# Altium footprint library hphonglib.PcbLib: 703 footprints (part 35 of 44)
Each footprint in its own frame and in the unit in brackets; x right, y up, seen from the top. Pads: shape width x height; smd on the part's side, far side on the other; paste and mask are expansions set on the pad; w line width, h text height; cw(c..) or ccw(c..) is an arc to the next point about the centre after c.
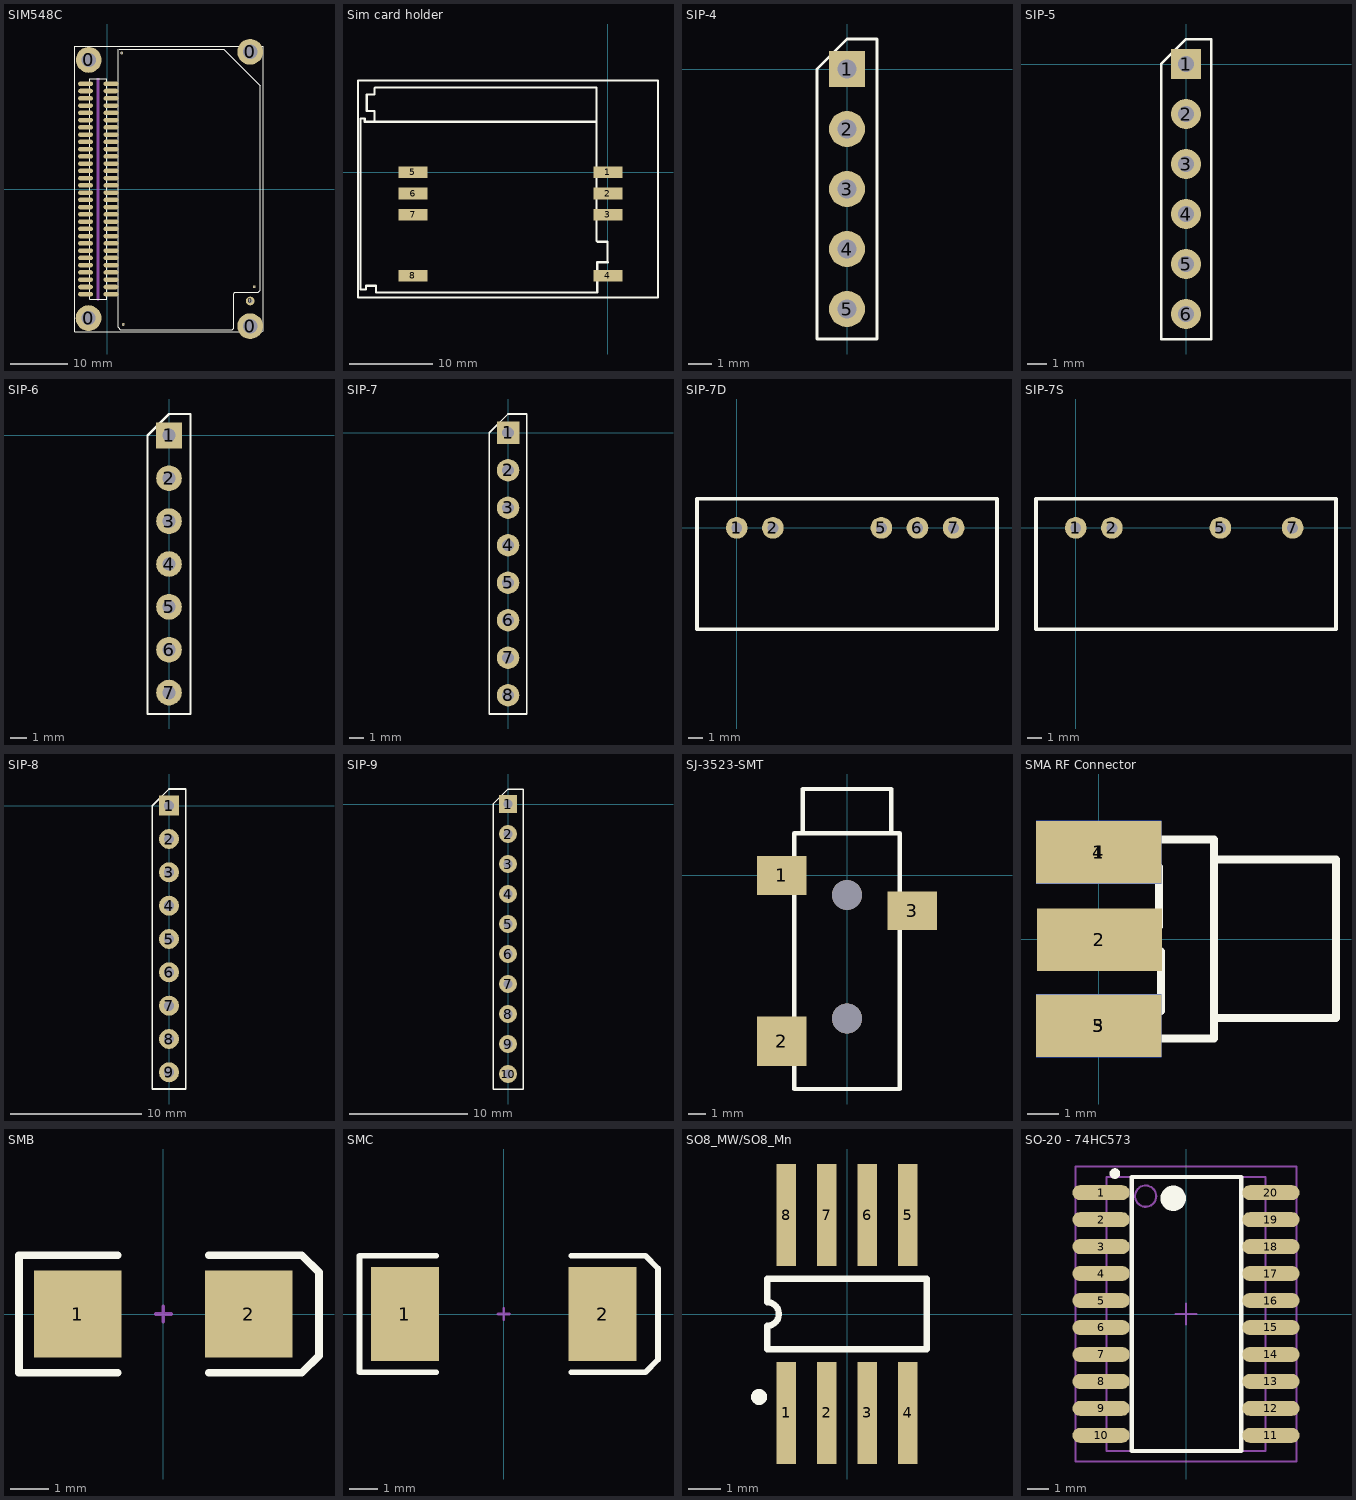
[diagram p34: the footprints below, top view; thin cyan lines are the x and y axes]

## SIM548C [mm] "SIM548C-60PIN"
pads (68):
  round 4.5 hole 2.5: 0(-3.28,-22.59) 0(-3.25,22.59) 0(25,-24) 0(25,24)
  round 0.5 hole 0.3: 0(2.5,23.8) 0(2.8,-23.7) 0(25.7,-17.1)
  round 1.524 hole 0.762: 0(25,-19.6)
  oval 2.6x0.8 smd: 1(-3.81,18.415) 2(0.635,18.415) 3(-3.81,17.145) 4(0.635,17.145) 5(-3.81,15.875) 6(0.635,15.875) 7(-3.81,14.605) 8(0.635,14.605) 9(-3.81,13.335) 10(0.635,13.335) 11(-3.81,12.065) 12(0.635,12.065) 13(-3.81,10.795) 14(0.635,10.795) 15(-3.81,9.525) 16(0.635,9.525) 17(-3.81,8.255) 18(0.635,8.255) 19(-3.81,6.985) 20(0.635,6.985) 21(-3.81,5.715) 22(0.635,5.715) 23(-3.81,4.445) 24(0.635,4.445) 25(-3.81,3.175) 26(0.635,3.175) 27(-3.81,1.905) 28(0.635,1.905) 29(-3.81,0.635) 30(0.635,0.635) 31(-3.81,-0.635) 32(0.635,-0.635) 33(-3.81,-1.905) 34(0.635,-1.905) 35(-3.81,-3.175) 36(0.635,-3.175) 37(-3.81,-4.445) 38(0.635,-4.445) 39(-3.81,-5.715) 40(0.635,-5.715) 41(-3.81,-6.985) 42(0.635,-6.985) 43(-3.81,-8.255) 44(0.635,-8.255) 45(-3.81,-9.525) 46(0.635,-9.525) 47(-3.81,-10.795) 48(0.635,-10.795) 49(-3.81,-12.065) 50(0.635,-12.065) 51(-3.81,-13.335) 52(0.635,-13.335) 53(-3.81,-14.605) 54(0.635,-14.605) 55(-3.81,-15.875) 56(0.635,-15.875) 57(-3.81,-17.145) 58(0.635,-17.145) 59(-3.81,-18.415) 60(0.635,-18.415)
Top Overlay:
  lines w0.17: 1.9,24.5 1.9,-24.2 2.3,-24.6 21.9,-24.6 22.1,-24.4 22.1,-18.3 22.3,-18.1 26.4,-18.1 26.8,-17.7 26.8,18.1 20.4,24.5 2.1,24.5 ; -5.715,-25 -5.715,25 27.305,25 27.305,-24.765 27.07,-25 -5.715,-25 ; -3.095,-19.265 -3.095,19.265 -2.345,19.265 -0.845,19.265 -0.075,19.265 -0.075,-19.265 -3.095,-19.265
Mechanical 1:
  lines w0.508: -1.6,-19.3 -1.6,19.2
3D body: height 3.5, standoff 0, extent -2.6,4.1 -1.9,4.9
3D body: height 3.5, standoff 0, extent -2.6,5.3 -1.9,6.1
3D body: height 3.5, standoff 0, extent -2.6,6.6 -1.9,7.4
3D body: height 3.5, standoff 0, extent -2.6,2.8 -1.9,3.6
3D body: height 3.5, standoff 0, extent -2.6,1.5 -1.9,2.3
3D body: height 3.5, standoff 0, extent -2.6,0.3 -1.9,1.1
3D body: height 3.5, standoff 0, extent -2.6,-1.1 -1.9,-0.3
3D body: height 3.5, standoff 0, extent -2.6,-2.4 -1.9,-1.6
3D body: height 3.5, standoff 0, extent -2.6,-3.6 -1.9,-2.8
3D body: height 3.5, standoff 0, extent -2.6,-4.9 -1.9,-4.1
3D body: height 3.5, standoff 0, extent -2.65,-6.2 -1.95,-5.4
3D body: height 3.5, standoff 0, extent -2.6,-7.4 -1.9,-6.6
3D body: height 3.5, standoff 0, extent -2.6,-8.7 -1.9,-7.9
3D body: height 3.5, standoff 0, extent -2.6,-10 -1.9,-9.2
3D body: height 3.5, standoff 0, extent -2.6,-11.2 -1.9,-10.4
3D body: height 3.5, standoff 0, extent -2.6,-12.5 -1.9,-11.7
3D body: height 3.5, standoff 0, extent -2.6,-13.8 -1.9,-13
3D body: height 3.5, standoff 0, extent -2.6,-15 -1.9,-14.2
3D body: height 3.5, standoff 0, extent -2.6,-16.3 -1.9,-15.5
3D body: height 3.5, standoff 0, extent -2.6,-17.6 -1.9,-16.8
3D body: height 3.5, standoff 0, extent -2.6,-18.8 -1.9,-18
3D body: height 3.5, standoff 0, extent -1.3,-16.3 -0.6,-15.5
3D body: height 3.5, standoff 0, extent -1.3,-17.6 -0.6,-16.8
3D body: height 3.5, standoff 0, extent -1.3,-18.8 -0.6,-18
3D body: height 3.5, standoff 0, extent -1.3,-12.5 -0.6,-11.7
3D body: height 3.5, standoff 0, extent -1.3,-13.8 -0.6,-13
3D body: height 3.5, standoff 0, extent -1.3,-15 -0.6,-14.2
3D body: height 3.5, standoff 0, extent -1.3,-8.7 -0.6,-7.9
3D body: height 3.5, standoff 0, extent -1.3,-10 -0.6,-9.2
3D body: height 3.5, standoff 0, extent -1.3,-11.2 -0.6,-10.4
3D body: height 3.5, standoff 0, extent -1.3,-4.9 -0.6,-4.1
3D body: height 3.5, standoff 0, extent -1.3,-6.2 -0.6,-5.4
3D body: height 3.5, standoff 0, extent -1.3,-7.4 -0.6,-6.6
3D body: height 3.5, standoff 0, extent -1.3,-1.1 -0.6,-0.3
3D body: height 3.5, standoff 0, extent -1.3,-2.4 -0.6,-1.6
3D body: height 3.5, standoff 0, extent -1.3,-3.6 -0.6,-2.8
3D body: height 3.5, standoff 0, extent -1.3,2.8 -0.6,3.6
3D body: height 3.5, standoff 0, extent -1.3,1.5 -0.6,2.3
3D body: height 3.5, standoff 0, extent -1.3,0.3 -0.6,1.1
3D body: height 3.5, standoff 0, extent -1.3,6.6 -0.6,7.4
3D body: height 3.5, standoff 0, extent -1.3,5.3 -0.6,6.1
3D body: height 3.5, standoff 0, extent -1.3,4.1 -0.6,4.9
3D body: height 3.5, standoff 0, extent -1.3,10.4 -0.6,11.2
3D body: height 3.5, standoff 0, extent -1.3,9.1 -0.6,9.9
3D body: height 3.5, standoff 0, extent -1.3,7.9 -0.6,8.7
3D body: height 3.5, standoff 0, extent -1.3,11.7 -0.6,12.5
3D body: height 3.5, standoff 0, extent -1.3,12.9 -0.6,13.7
3D body: height 3.5, standoff 0, extent -1.3,14.2 -0.6,15
3D body: height 3.5, standoff 0, extent -1.3,15.5 -0.6,16.3
3D body: height 3.5, standoff 0, extent -1.3,16.7 -0.6,17.5
3D body: height 3.5, standoff 0, extent -2.6,7.8 -1.9,8.6
3D body: height 3.5, standoff 0, extent -2.6,9.1 -1.9,9.9
3D body: height 3.5, standoff 0, extent -2.6,10.4 -1.9,11.2
3D body: height 3.5, standoff 0, extent -2.6,11.7 -1.9,12.5
3D body: height 3.5, standoff 0, extent -2.6,12.9 -1.9,13.7
3D body: height 3.5, standoff 0, extent -2.6,14.2 -1.9,15
3D body: height 3.5, standoff 0, extent -2.6,15.5 -1.9,16.3
3D body: height 3.5, standoff 0, extent -2.6,16.7 -1.9,17.5
3D body: height 3.5, standoff 0, extent -2.6,18 -1.9,18.8
3D body: height 3.5, standoff 0, extent -1.3,18 -0.6,18.8
3D body: height 3.5, standoff 0, extent -3.1,-19.3 -0.1,19.2

## Sim card holder [mm]
pads (8):
  rect 3.5x1.4 smd: 1(0,0) 2(0,-2.54) 3(0,-5.08) 4(0,-12.4) 5(-23.4,0) 6(-23.4,-2.54) 7(-23.4,-5.08) 8(-23.4,-12.4)
Top Overlay:
  lines w0.254: -29.718,-14.072 -29.718,-12.395 ; -29.718,-12.522 -29.718,6.452 -29.185,6.452 -29.185,6.071 -28.016,6.071 -28.016,7.366 -28.956,7.366 -28.956,9.322 -28.042,9.322 -28.042,10.058 -27.94,10.16 -1.397,10.16 -1.397,6.071 -27.965,6.071 ; -29.667,-14.072 -29.058,-14.072 -29.032,-14.046 -29.032,-13.614 -27.864,-13.614 ; -27.838,-13.64 -27.838,-14.427 -1.295,-14.427 -1.295,-10.795 -0.025,-10.795 -0.051,-10.77 -0.051,-8.306 -0.076,-8.331 -1.27,-8.331 -1.397,-8.204 -1.397,6.045 ; -24.9,-15 4,-15 5,-15 6,-15 6,5 6,10 6,11 -30,11 -30,5 -30,-15 -29,-15 -28,-15 -24,-15
3D body: height 2.5, standoff 0, extent -24.92,-9.895 5.08,7.405

## SIP-4 [mil]
pads (5):
  rect 60x60 hole 31.49 unplated: 1(0,0)
  round 60 hole 31.49 unplated: 2(0,-100) 3(0,-200) 4(0,-300) 5(0,-400)
Top Overlay:
  lines w5: -50,-450 50,-450 50,50 0,50 -50,0 -50,-450

## SIP-5 [mil]
pads (6):
  rect 60x60 hole 31.49 unplated: 1(0,0)
  round 60 hole 31.49 unplated: 2(0,-100) 3(0,-200) 4(0,-300) 5(0,-400) 6(0,-500)
Top Overlay:
  lines w5: -50,-550 50,-550 50,50 0,50 -50,0 -50,-550

## SIP-6 [mil]
pads (7):
  rect 60x60 hole 31.49 unplated: 1(0,0)
  round 60 hole 31.49 unplated: 2(0,-100) 3(0,-200) 4(0,-300) 5(0,-400) 6(0,-500) 7(0,-600)
Top Overlay:
  lines w5: -50,-650 50,-650 50,50 0,50 -50,0 -50,-650

## SIP-7 [mil]
pads (8):
  rect 60x60 hole 31.49 unplated: 1(0,0)
  round 60 hole 31.49 unplated: 2(0,-100) 3(0,-200) 4(0,-300) 5(0,-400) 6(0,-500) 7(0,-600) 8(0,-700)
Top Overlay:
  lines w5: -50,-750 -50,0 0,50 50,50 50,-750 -50,-750

## SIP-7D [mil] "Industry Standard SIP-7 Dual"
pads (5):
  round 60 hole 30: 1(0,0) 2(100,0) 5(400,0) 6(500,0) 7(600,0)
Top Overlay:
  lines w10: -110,-280 -110,80 720,80 720,-280 -110,-280

## SIP-7S [mil] "Industry Standard SIP-7 Single"
pads (4):
  round 60 hole 30: 1(0,0) 2(100,0) 5(400,0) 7(600,0)
Top Overlay:
  lines w10: -110,-280 -110,80 720,80 720,-280 -110,-280

## SIP-8 [mil]
pads (9):
  rect 60x60 hole 31.49 unplated: 1(0,0)
  round 60 hole 31.49 unplated: 2(0,-100) 3(0,-200) 4(0,-300) 5(0,-400) 6(0,-500) 7(0,-600) 8(0,-700) 9(0,-800)
Top Overlay:
  lines w5: -50,-850 50,-850 50,50 0,50 -50,0 -50,-850

## SIP-9 [mil]
pads (10):
  rect 60x60 hole 31.49 unplated: 1(0,0)
  round 60 hole 31.49 unplated: 2(0,-100) 3(0,-200) 4(0,-300) 5(0,-400) 6(0,-500) 7(0,-600) 8(0,-700) 9(0,-800) 10(0,-900)
Top Overlay:
  lines w5: -50,-950 -50,0 0,50 50,50 50,-950 -50,-950

## SJ-3523-SMT [mm] "CONN AUDIO JACK 3.5MM STEREO SMD"
pads (5):
  rect 2.8x2.2 smd: 1(-3.7,0) 3(3.7,-2)
  rect 2.8x2.8 smd: 2(-3.7,-9.4)
  round 1.7 hole 1.7 paste+0 mask+0: ""(0,-8.1) ""(0,-1.1)
Top Overlay:
  lines w0.254: -2.5,2.4 -2.5,4.9 2.5,4.9 2.5,2.4 ; -3,-12.1 3,-12.1 3,2.4 -3,2.4 -3,-12.1
Mechanical 13:
  text ".Designator" at 0.548,-8.93 h2.03
3D body: height 4.8, standoff 0.01, extent 2.5,-3.2 2.775,-1.5
3D body: height 4.8, standoff 0.01, extent -2.775,-10.35 -2.5,-8.65
3D body: height 4.8, standoff 0.01, extent -2.763,-0.5 -2.488,1.2
3D body: height 0.15, standoff 0.01, extent -4.512,-10.26 -2.5,-8.738
3D body: height 0.15, standoff 0.01, extent 2.498,-2.504 4.502,-1.496
3D body: height 0.15, standoff 0.01, extent -4.504,-0.504 -2.5,0.504
3D body: height 5, standoff 0.01, extent -3.006,-12.106 3.006,4.904
3D body: height 0.8, standoff 0, extent -0.868,-8.95 0.846,-7.235
3D body: height 0.8, standoff 0, extent -0.868,-1.95 0.846,-0.235

## SMA RF Connector [mm]
pads (5):
  rect 4x2 smd: 1(0,2.77) 2(0.025,-0.025) 3(0,-2.77)
  rect 4x2 smd far side: 4(0,2.77) 5(0,-2.77)
Top Overlay:
  lines w0.254: 1.93,2.286 1.93,0.4 -1.168,0.4 -1.168,-0.4 1.981,-0.4 1.981,-2.3 -1.092,-2.3 -1.092,-3.17 3.683,-3.17 3.683,3.17 -1.168,3.17 -1.168,2.3 1.93,2.3 ; 3.683,-2.515 7.569,-2.515 7.569,2.54 3.683,2.54

## SMB [mm] "DO-214-AA/SMB; 2 C-Bend Leads; Body 5.3 x 3.6 mm, inc. leads (LxW)"
height 2.54
pads (2):
  rect 2.3x2.3 smd: 1(-2.25,0) 2(2.25,0)
Top Overlay:
  lines w0.2: -1.2,-1.55 -3.8,-1.55 -3.8,1.55 -1.2,1.55 ; 1.2,-1.55 3.65,-1.55 4.1,-1.1 4.1,1.1 3.65,1.55 1.2,1.55
Mechanical 1:
  lines w0.1: -0.2,0 0.2,0 ; 0,-0.2 0,0.2

## SMC [mm] "DO-214-AB/SMC; 2 C-Bend Leads; Body 7.9 x 5.9 mm, inc. leads (LxW)"
height 2.65
pads (2):
  rect 2.4x3.3 smd: 1(-3.475,0) 2(3.475,0)
Top Overlay:
  lines w0.2: -2.375,-2.05 -5.075,-2.05 -5.075,2.05 -2.375,2.05 ; 2.375,-2.05 4.975,-2.05 5.425,-1.6 5.425,1.6 4.975,2.055 ; 2.375,2.05 4.975,2.05
Mechanical 1:
  lines w0.1: -0.2,0 0.2,0 ; 0,-0.2 0,0.2

## SO8_MW/SO8_Mn [mm] "Small Outline; 8 Leads; Body Width 5.2 mm; Pitch 1.27 mm"
pads (8):
  rect 0.6x3.2 smd: 1(-1.905,-3.1) 2(-0.635,-3.1) 3(0.635,-3.1) 4(1.905,-3.1) 5(1.905,3.1) 6(0.635,3.1) 7(-0.635,3.1) 8(-1.905,3.1)
Top Overlay:
  circle w0.25: c-2.755,-2.6 r0.125
  lines w0.2: -2.5,-1.1 -2.5,-0.367 ccw(c-2.5,0) -2.5,0.367 -2.5,1.1 2.5,1.1 2.5,-1.1 -2.5,-1.1

## SO-20 - 74HC573 [mm] ": plastic small outline package; 20 leads; body width 7.5 mm"
height 2
pads (20):
  oval 2.7x0.7 smd: 1(-4,5.715) 2(-4,4.445) 3(-4,3.175) 4(-4,1.905) 5(-4,0.635) 6(-4,-0.635) 7(-4,-1.905) 8(-4,-3.175) 9(-4,-4.445) 10(-4,-5.715) 11(4,-5.715) 12(4,-4.445) 13(4,-3.175) 14(4,-1.905) 15(4,-0.635) 16(4,0.635) 17(4,1.905) 18(4,3.175) 19(4,4.445) 20(4,5.715)
Top Overlay:
  circle w0.6: c-0.6,5.45 r0.3
  circle w0.25: c-3.35,6.615 r0.125
  lines w0.2: -2.55,-6.45 2.6,-6.45 2.6,6.45 -2.55,6.45 -2.55,-6.45
Mechanical 2:
  text "74HC573" at 0.375,5.225 h1.52
Mechanical 13:
  circle w0.1: c-1.9,5.55 r0.5
  lines w0.1: -3.75,-6.45 3.75,-6.45 3.75,6.45 -3.75,6.45 -3.75,-6.45
Mechanical 15:
  lines w0.1: -0.5,0 0.5,0 ; 0,-0.5 0,0.5 ; -5.2,-6.95 5.2,-6.95 5.2,6.95 -5.2,6.95 -5.2,-6.95
3D body: height 0.25, standoff 0, extent 3.75,5.465 5.26,5.983
3D body: height 0.25, standoff 0, extent -5.26,5.492 -3.75,6.01
3D body: height 0.25, standoff 0, extent -5.26,4.192 -3.75,4.71
3D body: height 0.25, standoff 0, extent 3.75,4.165 5.26,4.683
3D body: height 0.25, standoff 0, extent -5.26,2.917 -3.75,3.435
3D body: height 0.25, standoff 0, extent 3.75,2.89 5.26,3.408
3D body: height 0.25, standoff 0, extent -5.26,1.642 -3.75,2.16
3D body: height 0.25, standoff 0, extent 3.75,1.615 5.26,2.133
3D body: height 0.25, standoff 0, extent -5.26,0.367 -3.75,0.885
3D body: height 0.25, standoff 0, extent 3.75,0.34 5.26,0.858
3D body: height 0.25, standoff 0, extent -5.26,-0.883 -3.75,-0.365
3D body: height 0.25, standoff 0, extent 3.75,-0.91 5.26,-0.392
3D body: height 0.25, standoff 0, extent -5.26,-2.158 -3.75,-1.64
3D body: height 0.25, standoff 0, extent 3.75,-2.185 5.26,-1.667
3D body: height 0.25, standoff 0, extent -5.26,-3.433 -3.75,-2.915
3D body: height 0.25, standoff 0, extent 3.75,-3.46 5.26,-2.942
3D body: height 0.25, standoff 0, extent -5.26,-4.708 -3.75,-4.19
3D body: height 0.25, standoff 0, extent 3.75,-4.735 5.26,-4.217
3D body: height 0.25, standoff 0, extent -5.26,-5.958 -3.75,-5.44
3D body: height 0.25, standoff 0, extent 3.75,-5.985 5.26,-5.467
3D body: height 2, standoff 0, extent -3.75,-6.45 3.75,6.45